# Altium footprint library Generic Footprint.PcbLib: 160 footprints (part 10 of 20) (continued)
## Symbol_CE-Logo-6x4mm_Silkscreen [mil] (continued)
1(89.67,165.14) 1(89.9,0.73) 1(89.9,25.3) 1(90.38,165.14) 1(91.32,0.97) 1(91.32,25.3) 1(91.79,1.21) 1(91.79,1.44) 1(91.79,1.68) 1(91.79,1.92) 1(91.79,2.15) 1(91.79,2.39) 1(91.79,2.62) 1(91.79,2.86) 1(91.79,3.1) 1(91.79,3.33) 1(91.79,3.57) 1(91.79,3.81) 1(91.79,4.04) 1(91.79,4.28) 1(91.79,4.51) 1(91.79,4.75) 1(91.79,4.99) 1(91.79,5.22) 1(91.79,5.46) 1(91.79,5.7) 1(91.79,5.93) 1(91.79,6.17) 1(91.79,6.4) 1(91.79,6.64) 1(91.79,6.88) 1(91.79,7.11) 1(91.79,7.35) 1(91.79,7.59) 1(91.79,7.82) 1(91.79,8.06) 1(91.79,8.29) 1(91.79,8.53) 1(91.79,8.77) 1(91.79,9) 1(91.79,9.24) 1(91.79,9.48) 1(91.79,9.71) 1(91.79,9.95) 1(91.79,10.18) 1(91.79,10.42) 1(91.79,10.66) 1(91.79,10.89) 1(91.79,11.13) 1(91.79,11.36) 1(91.79,11.6) 1(91.79,11.84) 1(91.79,12.07) 1(91.79,12.31) 1(91.79,12.55) 1(91.79,12.78) 1(91.79,13.02) 1(91.79,13.25) 1(91.79,13.49) 1(91.79,13.73) 1(91.79,13.96) 1(91.79,14.2) 1(91.79,14.44) 1(91.79,14.67) 1(91.79,14.91) 1(91.79,15.14) 1(91.79,15.38) 1(91.79,15.62) 1(91.79,15.85) 1(91.79,16.09) 1(91.79,16.33) 1(91.79,16.56) 1(91.79,16.8) 1(91.79,17.03) 1(91.79,17.27) 1(91.79,17.51) 1(91.79,17.74) 1(91.79,17.98) 1(91.79,18.22) 1(91.79,18.45) 1(91.79,18.69) 1(91.79,18.92) 1(91.79,19.16) 1(91.79,19.4) 1(91.79,19.63) 1(91.79,19.87) 1(91.79,20.11) 1(91.79,20.34) 1(91.79,20.58) 1(91.79,20.81) 1(91.79,21.05) 1(91.79,21.29) 1(91.79,21.52) 1(91.79,21.76) 1(91.79,21.99) 1(91.79,22.23) 1(91.79,22.47) 1(91.79,22.7) 1(91.79,22.94) 1(91.79,23.18) 1(91.79,23.41) 1(91.79,23.65) 1(91.79,23.88) 1(91.79,24.12) 1(91.79,24.36) 1(91.79,24.59) 1(91.79,24.83) 1(91.79,25.07) 1(91.79,25.3) 1(91.79,141.05) 1(91.79,141.29) 1(91.79,141.52) 1(91.79,141.76) 1(91.79,141.99) 1(91.79,142.23) 1(91.79,142.47) 1(91.79,142.7) 1(91.79,142.94) 1(91.79,143.18) 1(91.79,143.41) 1(91.79,143.65) 1(91.79,143.88) 1(91.79,144.12) 1(91.79,144.36) 1(91.79,144.59) 1(91.79,144.83) 1(91.79,145.07) 1(91.79,145.3) 1(91.79,145.54) 1(91.79,145.77) 1(91.79,146.01) 1(91.79,146.25) 1(91.79,146.48) 1(91.79,146.72) 1(91.79,146.96) 1(91.79,147.19) 1(91.79,147.43) 1(91.79,147.66) 1(91.79,147.9) 1(91.79,148.14) 1(91.79,148.37) 1(91.79,148.61) 1(91.79,148.85) 1(91.79,149.08) 1(91.79,149.32) 1(91.79,149.55) 1(91.79,149.79) 1(91.79,150.03) 1(91.79,150.26) 1(91.79,150.5) 1(91.79,150.74) 1(91.79,150.97) 1(91.79,151.21) 1(91.79,151.44) 1(91.79,151.68) 1(91.79,151.92) 1(91.79,152.15) 1(91.79,152.39) 1(91.79,152.62) 1(91.79,152.86) 1(91.79,153.1) 1(91.79,153.33) 1(91.79,153.57) 1(91.79,153.81) 1(91.79,154.04) 1(91.79,154.28) 1(91.79,154.51) 1(91.79,154.75) 1(91.79,154.99) 1(91.79,155.22) 1(91.79,155.46) 1(91.79,155.7) 1(91.79,155.93) 1(91.79,156.17) 1(91.79,156.4) 1(91.79,156.64) 1(91.79,156.88) 1(91.79,157.11) 1(91.79,157.35) 1(91.79,157.59) 1(91.79,157.82) 1(91.79,158.06) 1(91.79,158.29) 1(91.79,158.53) 1(91.79,158.77) 1(91.79,159) 1(91.79,159.24) 1(91.79,159.48) 1(91.79,159.71) 1(91.79,159.95) 1(91.79,160.18) 1(91.79,160.42) 1(91.79,160.66) 1(91.79,160.89) 1(91.79,161.13) 1(91.79,161.36) 1(91.79,161.6) 1(91.79,161.84) 1(91.79,162.07) 1(91.79,162.31) 1(91.79,162.55) 1(91.79,162.78) 1(91.79,163.02) 1(91.79,163.25) 1(91.79,163.49) 1(91.79,163.73) 1(91.79,163.96) 1(91.79,164.2) 1(91.79,164.44) 1(91.79,164.67) 1(92.03,164.91) 1(141.87,79.4) 1(141.87,79.63) 1(141.87,79.87) 1(141.87,80.11) 1(141.87,80.34) 1(141.87,84.12) 1(141.87,84.36) 1(141.87,84.59) 1(141.87,85.07) 1(141.87,85.3) 1(141.87,85.54) 1(141.87,85.77) 1(141.87,86.01) 1(141.87,86.25) 1(141.87,86.48) 1(141.87,86.72) 1(141.87,86.96) 1(142.11,79.16) 1(142.11,80.58) 1(142.11,80.81) 1(142.11,81.05) 1(142.11,81.29) 1(142.11,81.52) 1(142.11,81.76) 1(142.11,81.99) 1(142.11,82.23) 1(142.11,82.47) 1(142.11,82.7) 1(142.11,82.94) 1(142.11,83.18) 1(142.11,83.41) 1(142.11,83.65) 1(142.11,83.88) 1(142.35,74.67) 1(142.35,74.91) 1(142.35,75.14) 1(142.35,75.38) 1(142.35,75.62) 1(142.35,75.85) 1(142.35,76.09) 1(142.35,76.33) 1(142.35,76.56) 1(142.35,76.8) 1(142.35,77.03) 1(142.35,77.27) 1(142.35,77.51) 1(142.35,77.74) 1(142.35,77.98) 1(142.35,78.22) 1(142.35,78.45) 1(142.35,78.69) 1(142.35,78.92) 1(142.35,84.83) 1(142.35,87.19) 1(142.35,87.43) 1(142.35,87.66) 1(142.35,87.9) 1(142.35,88.14) 1(142.35,88.37) 1(142.35,88.61) 1(142.35,88.85) 1(142.35,89.08) 1(142.35,89.32) 1(142.35,89.55) 1(142.35,89.79) 1(142.35,90.03) 1(142.35,90.26) 1(142.35,90.5) 1(142.58,74.2) 1(142.58,74.44) 1(142.82,70.42) 1(142.82,70.66) 1(142.82,71.6) 1(142.82,72.31) 1(142.82,72.78) 1(142.82,73.02) 1(142.82,73.25) 1(142.82,73.73) 1(142.82,73.96) 1(142.82,90.74) 1(142.82,91.21) 1(142.82,91.68) 1(142.82,91.92) 1(142.82,92.15) 1(142.82,92.39) 1(142.82,92.62) 1(142.82,92.86) 1(142.82,93.1) 1(142.82,93.33) 1(142.82,93.81) 1(142.82,94.75) 1(142.82,95.46) 1(143.05,69.71) 1(143.05,69.95) 1(143.05,70.18) 1(143.05,70.89) 1(143.05,71.13) 1(143.05,71.36) 1(143.05,71.84) 1(143.05,72.07) 1(143.05,72.55) 1(143.05,73.49) 1(143.05,90.97) 1(143.05,91.44) 1(143.05,93.57) 1(143.05,94.04) 1(143.05,94.28) 1(143.05,94.51) 1(143.05,94.99) 1(143.05,95.22) 1(143.05,95.7) 1(143.29,69) 1(143.29,69.24) 1(143.29,69.48) 1(143.29,95.93) 1(143.29,96.17) 1(143.29,96.4) 1(143.29,96.64) 1(143.53,66.64) 1(143.53,66.88) 1(143.53,68.29) 1(143.53,96.88) 1(143.53,97.11) 1(143.53,97.59) 1(143.53,98.53) 1(143.53,99) 1(143.76,65.7) 1(143.76,65.93) 1(143.76,66.17) 1(143.76,66.4) 1(143.76,67.11) 1(143.76,67.35) 1(143.76,67.59) 1(143.76,67.82) 1(143.76,68.06) 1(143.76,68.53) 1(143.76,68.77) 1(143.76,97.35) 1(143.76,97.82) 1(143.76,98.06) 1(143.76,98.29) 1(143.76,98.77) 1(143.76,99.24) 1(143.76,99.48) 1(143.76,100.42) 1(144,65.22) 1(144,65.46) 1(144,99.71) 1(144,99.95) 1(144,100.18) 1(144.23,64.28) 1(144.23,64.99) 1(144.47,62.86) 1(144.47,63.1) 1(144.47,63.33) 1(144.47,63.57) 1(144.47,63.81) 1(144.47,64.04) 1(144.47,64.51) 1(144.47,64.75) 1(144.47,100.66) 1(144.47,100.89) 1(144.47,101.13) 1(144.47,101.36) 1(144.47,101.6) 1(144.47,101.84) 1(144.47,102.07) 1(144.47,102.31) 1(144.47,102.55) 1(144.47,103.25) 1(144.71,62.15) 1(144.71,62.39) 1(144.71,62.62) 1(144.71,102.78) 1(144.71,103.02) 1(144.94,61.92) 1(144.94,103.49) 1(145.18,59.79) 1(145.18,60.26) 1(145.18,60.5) 1(145.18,60.73) 1(145.18,60.97) 1(145.18,61.21) 1(145.18,61.44) 1(145.18,61.68) 1(145.18,103.73) 1(145.18,103.96) 1(145.18,104.2) 1(145.18,104.44) 1(145.18,104.67) 1(145.18,104.91) 1(145.18,105.38) 1(145.18,105.62) 1(145.42,60.03) 1(145.42,105.14) 1(145.89,58.14) 1(145.89,58.85) 1(145.89,59.08) 1(145.89,59.32) 1(145.89,59.55) 1(145.89,105.85) 1(145.89,106.8) 1(146.12,57.43) 1(146.12,57.66) 1(146.12,57.9) 1(146.12,58.37) 1(146.12,58.61) 1(146.12,106.09) 1(146.12,106.33) 1(146.12,106.56) 1(146.12,107.03) 1(146.12,107.27) 1(146.12,107.51) 1(146.12,107.74) 1(146.12,107.98) 1(146.6,55.54) 1(146.6,56.96) 1(146.6,108.22) 1(146.6,108.45) 1(146.6,108.69) 1(146.6,109.4) 1(146.83,55.3) 1(146.83,55.77) 1(146.83,56.01) 1(146.83,56.25) 1(146.83,56.48) 1(146.83,56.72) 1(146.83,57.19) 1(146.83,108.92) 1(146.83,109.16) 1(146.83,109.63) 1(146.83,109.87) 1(146.83,110.11) 1(146.83,110.34) 1(147.31,55.07) 1(147.54,53.18) 1(147.54,53.41) 1(147.54,53.65) 1(147.54,53.88) 1(147.54,54.12) 1(147.54,54.36) 1(147.54,54.59) 1(147.54,54.83) 1(147.54,110.58) 1(147.54,110.81) 1(147.54,111.05) 1(147.54,111.29) 1(147.54,111.52) 1(147.54,111.76) 1(147.54,111.99) 1(147.54,112.23) 1(147.78,52.94) 1(147.78,112.47) 1(148.01,112.7) 1(148.25,51.29) 1(148.25,51.52) 1(148.25,51.76) 1(148.25,51.99) 1(148.25,52.23) 1(148.25,52.47) 1(148.25,52.7) 1(148.25,112.94) 1(148.25,113.18) 1(148.25,113.41) 1(148.25,113.65) 1(148.25,113.88) 1(148.25,114.12) 1(148.49,50.81) 1(148.49,51.05) 1(148.96,49.4) 1(148.96,50.11) 1(148.96,50.58) 1(148.96,114.36) 1(148.96,114.59) 1(148.96,114.83) 1(148.96,115.07) 1(148.96,115.3) 1(148.96,115.54) 1(149.2,49.63) 1(149.2,49.87) 1(149.2,50.34) 1(149.2,115.77) 1(149.2,116.01) 1(149.2,116.25) 1(149.43,49.16) 1(149.67,47.74) 1(149.67,48.22) 1(149.67,48.69) 1(149.67,48.92) 1(149.67,116.48) 1(149.67,117.19) 1(149.9,47.98) 1(149.9,48.45) 1(149.9,116.72) 1(149.9,116.96) 1(149.9,117.43) 1(149.9,117.66) 1(149.9,117.9) 1(150.14,47.51) 1(150.38,47.27) 1(150.61,46.33) 1(150.61,46.56) 1(150.61,46.8) 1(150.61,47.03) 1(150.61,118.14) 1(150.61,118.37) 1(150.61,118.61) 1(150.61,118.85) 1(150.61,119.08) 1(150.61,119.32) 1(150.85,46.09) 1(151.09,45.38) 1(151.09,119.55) 1(151.32,44.67) 1(151.32,44.91) 1(151.32,45.14) 1(151.32,45.62) 1(151.32,45.85) 1(151.32,119.79) 1(151.32,120.03) 1(151.32,120.26) 1(151.32,120.5) 1(151.32,120.74) 1(151.56,120.97) 1(152.03,43.49) 1(152.03,43.73) 1(152.03,43.96) 1(152.03,44.2) 1(152.03,44.44) 1(152.03,121.21) 1(152.03,121.44) 1(152.03,121.68) 1(152.03,121.92) 1(152.27,43.02) 1(152.27,43.25) 1(152.27,122.15) 1(152.27,122.39) 1(152.74,41.84) 1(152.74,42.07) 1(152.74,122.62) 1(152.98,42.31) 1(152.98,42.55) 1(152.98,42.78) 1(152.98,122.86) 1(152.98,123.1) 1(153.21,41.6) 1(153.45,123.33) 1(153.45,123.81) 1(153.68,40.89) 1(153.68,41.13) 1(153.68,41.36) 1(153.68,123.57) 1(153.68,124.04) 1(153.68,124.28) 1(153.68,124.51) 1(153.68,124.75) 1(154.16,39.95) 1(154.16,40.18) 1(154.16,40.66) 1(154.16,125.22) 1(154.39,39.48) 1(154.39,39.71) 1(154.39,40.42) 1(154.39,124.99) 1(154.39,125.46) 1(154.39,125.7) 1(154.39,125.93) 1(154.39,126.17) 1(154.86,39.24) 1(155.1,38.53) 1(155.1,38.77) 1(155.1,39) 1(155.1,126.4) 1(155.1,126.64) 1(155.1,126.88) 1(155.81,37.11) 1(155.81,37.35) 1(155.81,37.59) 1(155.81,37.82) 1(155.81,38.06) 1(155.81,38.29) 1(155.81,127.11) 1(155.81,127.35) 1(155.81,127.59) 1(155.81,127.82) 1(155.81,128.06) 1(155.81,128.29) 1(155.81,128.53) 1(156.52,36.88) 1(156.52,128.77) 1(156.52,129.24) 1(156.75,36.4) 1(156.75,36.64) 1(156.75,129) 1(156.99,36.17) 1(157.23,35.22) 1(157.23,35.7) 1(157.23,35.93) 1(157.23,129.48) 1(157.23,129.95) 1(157.46,34.75) 1(157.46,34.99) 1(157.46,35.46) 1(157.46,129.71) 1(157.46,130.18) 1(157.46,130.42) 1(157.46,130.66) 1(157.7,130.89) 1(158.17,34.04) 1(158.17,34.28) 1(158.17,34.51) 1(158.17,131.13) 1(158.17,131.36) 1(158.17,131.6) 1(158.64,131.84) 1(158.88,33.33) 1(158.88,33.57) 1(158.88,33.81) 1(158.88,132.07) 1(158.88,132.31) 1(159.59,32.39) 1(159.59,32.62) 1(159.59,33.1) 1(159.59,132.55) 1(159.59,132.78) 1(159.59,133.02) 1(159.59,133.25) 1(159.83,31.92) 1(159.83,32.15) 1(159.83,32.86) 1(159.83,133.49) 1(159.83,133.73) 1(160.06,31.68) 1(160.3,31.21) 1(160.3,31.44) 1(160.3,133.96) 1(160.53,30.97) 1(160.53,134.2) 1(160.53,134.44) 1(160.77,134.67) 1(161.24,30.26) 1(161.24,30.5) 1(161.24,30.73) 1(161.24,134.91) 1(161.24,135.14) 1(161.24,135.38) 1(161.48,30.03) 1(161.95,29.55) 1(161.95,29.79) 1(161.95,135.62) 1(161.95,135.85) 1(161.95,136.09) 1(162.19,29.32) 1(162.66,28.61) 1(162.66,28.85) 1(162.66,29.08) 1(162.66,136.33) 1(162.66,136.56) 1(162.66,136.8) 1(163.37,28.37) 1(163.37,137.03) 1(163.37,137.51) 1(163.61,27.9) 1(163.61,28.14) 1(163.61,137.27) 1(164.08,26.96) 1(164.08,27.19) 1(164.08,27.43) 1(164.08,27.66) 1(164.08,137.74) 1(164.08,138.22) 1(164.31,26.25) 1(164.31,26.48) 1(164.31,26.72) 1(164.31,137.98) 1(164.31,138.45) 1(164.31,138.69) 1(164.31,138.92) 1(164.55,139.16) 1(164.79,26.01) 1(165.02,25.77) 1(165.02,139.4) 1(165.02,139.63) 1(165.02,139.87) 1(165.26,25.54) 1(165.49,25.3) 1(165.49,140.11) 1(165.73,25.07) 1(165.73,140.34) 1(165.73,140.58) 1(166.44,24.36) 1(166.44,24.59) 1(166.44,24.83) 1(166.44,140.81) 1(166.44,141.05) 1(166.44,141.29) 1(166.68,24.12) 1(167.15,23.65) 1(167.15,23.88) 1(167.15,141.52) 1(167.38,23.41) 1(167.38,141.76) 1(167.38,141.99) 1(167.38,142.23) 1(167.62,69.71) 1(167.62,70.42) 1(167.62,70.66) 1(167.62,95.46) 1(167.62,95.7) 1(167.86,23.18) 1(167.86,69.48) 1(167.86,69.95) 1(167.86,70.18) 1(167.86,70.89) 1(167.86,95.22) 1(167.86,95.93) 1(168.09,22.47) 1(168.09,22.7) 1(168.09,22.94) 1(168.09,69.24) 1(168.09,96.17) 1(168.09,96.4) 1(168.09,96.64) 1(168.09,142.47) 1(168.09,142.7) 1(168.33,68.77) 1(168.33,71.13) 1(168.33,96.88) 1(168.33,97.11) 1(168.33,142.94) 1(168.57,66.64) 1(168.57,66.88) 1(168.57,67.11) 1(168.57,67.35) 1(168.57,67.59) 1(168.57,67.82) 1(168.57,68.06) 1(168.57,68.29) 1(168.57,68.53) 1(168.57,69) 1(168.57,71.13) 1(168.57,95.22) 1(168.57,97.35) 1(168.57,97.59) 1(168.57,97.82) 1(168.57,98.06) 1(168.57,98.29) 1(168.57,98.53) 1(168.57,98.77) 1(168.57,99) 1(168.8,22.23) 1(168.8,66.4) 1(168.8,70.89) 1(168.8,95.22) 1(168.8,99.24) 1(169.04,21.99) 1(169.04,66.17) 1(169.04,70.89) 1(169.04,99.48) 1(169.04,99.71) 1(169.27,21.76) 1(169.27,64.04) 1(169.27,64.28) 1(169.27,64.51) 1(169.27,64.75) 1(169.27,64.99) 1(169.27,65.22) 1(169.27,65.46) 1(169.27,65.7) 1(169.27,65.93) 1(169.27,99.95) 1(169.27,100.18) 1(169.27,100.42) 1(169.27,100.66) 1(169.27,100.89) 1(169.27,101.13) 1(169.27,101.36) 1(169.51,143.18) 1(169.51,143.41) 1(169.51,143.65) 1(169.75,101.6) 1(169.75,101.84) 1(169.98,62.15) 1(169.98,62.39) 1(169.98,62.62) 1(169.98,62.86) 1(169.98,63.1) 1(169.98,63.33) 1(169.98,63.57) 1(169.98,63.81) 1(169.98,102.07) 1(169.98,102.31) 1(169.98,102.55) 1(169.98,102.78) 1(169.98,103.02) 1(169.98,103.25) 1(169.98,103.49) 1(169.98,103.73) 1(170.22,21.05) 1(170.22,21.29) 1(170.22,21.52) 1(170.22,61.92) 1(170.22,143.88) 1(170.22,144.12) 1(170.22,144.36) 1(170.46,103.96) 1(170.69,60.5) 1(170.69,60.73) 1(170.69,60.97) 1(170.69,61.21) 1(170.69,61.44) 1(170.69,104.2) 1(170.69,104.44) 1(170.69,104.67) 1(170.69,104.91) 1(170.69,105.14) 1(170.69,105.38) 1(170.69,105.62) 1(170.69,105.85) 1(170.93,20.34) 1(170.93,20.58) 1(170.93,20.81) 1(170.93,60.26) 1(170.93,61.68) 1(170.93,106.09) 1(170.93,144.59) 1(170.93,144.83) 1(170.93,145.07) 1(170.93,145.3) 1(171.16,60.26) 1(171.16,106.09) 1(171.16,145.3) 1(171.4,59.55) 1(171.4,59.79) 1(171.4,60.03) 1(171.4,60.26) 1(171.4,106.09) 1(171.64,20.11) 1(171.64,58.14) 1(171.64,58.37) 1(171.64,58.61) 1(171.64,58.85) 1(171.64,59.08) 1(171.64,59.32) 1(171.64,106.33) 1(171.64,106.56) 1(171.64,106.8) 1(171.64,107.03) 1(171.64,107.27) 1(171.64,107.51) 1(171.64,145.3) 1(171.64,145.54) 1(171.64,145.77) 1(171.87,19.63) 1(171.87,19.87) 1(171.87,146.01) 1(172.35,56.48) 1(172.35,56.72) 1(172.35,56.96) 1(172.35,57.19) 1(172.35,57.43) 1(172.35,57.66) 1(172.35,57.9) 1(172.35,107.74) 1(172.35,107.98) 1(172.35,108.22) 1(172.35,108.45) 1(172.35,108.69) 1(172.35,108.92) 1(172.58,18.92) 1(172.58,19.16) 1(172.58,19.4) 1(172.58,146.25) 1(172.58,146.48) 1(172.58,146.72) 1(172.82,18.69) 1(172.82,109.16) 1(173.05,18.69) 1(173.05,55.07) 1(173.05,55.3) 1(173.05,55.54) 1(173.05,55.77) 1(173.05,56.01) 1(173.05,56.25) 1(173.05,109.4) 1(173.05,109.63) 1(173.05,109.87) 1(173.05,110.11) 1(173.05,110.34) 1(173.29,18.22) 1(173.29,18.45) 1(173.29,18.69) 1(173.29,146.96) 1(173.29,147.19) 1(173.53,17.98) 1(173.53,110.58) 1(173.53,147.43) 1(173.76,54.36) 1(173.76,54.59) 1(173.76,54.83) 1(173.76,110.81) 1(173.76,111.05) 1(173.76,111.29) 1(173.76,111.76) 1(173.76,111.99) 1(174,111.52) 1(174.23,17.98) 1(174.23,54.12) 1(174.47,17.98) 1(174.47,52.94) 1(174.47,53.41) 1(174.47,53.65) 1(174.47,53.88) 1(174.47,112.23) 1(174.47,112.47) 1(174.47,112.7) 1(174.71,17.27) 1(174.71,17.74) 1(174.71,52.7) 1(174.71,53.18) 1(174.71,112.94) 1(174.71,147.66) 1(174.71,147.9) 1(174.71,148.14) 1(174.94,17.51) 1(175.18,52.47) 1(175.42,17.03) 1(175.42,51.29) 1(175.42,51.52) 1(175.42,51.76) 1(175.42,51.99) 1(175.42,52.23) 1(175.42,113.18) 1(175.42,113.41) 1(175.42,113.65) 1(175.42,113.88) 1(175.42,114.12) 1(175.42,114.36) 1(175.42,148.37) 1(175.65,16.56) 1(175.65,16.8) 1(175.65,148.61) 1(175.65,148.85) 1(175.65,149.08) 1(176.12,50.58) 1(176.12,50.81) 1(176.12,51.05) 1(176.12,114.59) 1(176.12,114.83) 1(176.12,115.07) 1(176.12,149.32) 1(176.36,15.85) 1(176.36,16.09) 1(176.36,16.33) 1(176.36,149.55) 1(176.6,50.34) 1(176.6,115.3) 1(176.6,149.79) 1(176.83,48.92) 1(176.83,49.16) 1(176.83,49.4) 1(176.83,49.63) 1(176.83,49.87) 1(176.83,50.11) 1(176.83,115.54) 1(176.83,115.77) 1(176.83,116.01) 1(176.83,116.25) 1(176.83,116.48) 1(177.07,15.62) 1(177.31,15.62) 1(177.31,116.72) 1(177.54,15.62) 1(177.54,48.45) 1(177.54,48.69) 1(177.54,116.96) 1(177.54,117.19) 1(177.78,15.14) 1(177.78,48.22) 1(177.78,150.03) 1(177.78,150.26) 1(177.78,150.5) 1(178.01,14.91) 1(178.01,15.38) 1(178.01,117.43) 1(178.25,47.98) 1(178.25,117.66) 1(178.25,117.9) 1(178.25,118.61) 1(178.49,14.67) 1(178.49,47.51) 1(178.49,47.74) 1(178.49,118.14) 1(178.49,118.37) 1(178.49,118.85) 1(178.49,150.74) 1(178.72,14.44) 1(178.72,150.97) 1(178.72,151.21) 1(178.96,14.2) 1(178.96,47.03) 1(178.96,47.27) 1(179.2,45.85) 1(179.2,46.09) 1(179.2,46.33) 1(179.2,46.56) 1(179.2,46.8) 1(179.2,119.08) 1(179.2,119.32) 1(179.2,119.55) 1(179.43,14.2) 1(179.67,14.2) 1(179.9,45.38) 1(179.9,45.62) 1(179.9,119.79) 1(179.9,120.03) 1(179.9,120.26) 1(179.9,151.44) 1(180.14,13.49) 1(180.14,13.73) 1(180.14,13.96) 1(180.14,45.14) 1(180.14,120.5) 1(180.14,151.68) 1(180.14,151.92) 1(180.38,120.5) 1(180.61,44.44) 1(180.61,44.67) 1(180.61,44.91) 1(180.61,120.5) 1(180.61,120.74) 1(180.61,120.97) 1(180.61,152.15) 1(180.85,13.02) 1(180.85,13.25) 1(180.85,152.39) 1(180.85,152.62) 1(181.09,121.21) 1(181.09,152.86) 1(181.32,12.78) 1(181.32,43.96) 1(181.32,44.2) 1(181.32,121.44) 1(181.32,121.68) 1(181.56,43.73) 1(181.56,121.92) 1(182.03,43.02) 1(182.03,43.49) 1(182.03,122.15) 1(182.03,122.62) 1(182.27,12.55) 1(182.27,43.25) 1(182.27,122.39) 1(182.27,153.1) 1(182.27,153.33) 1(182.5,12.07) 1(182.5,12.31) 1(182.5,42.78) 1(182.5,153.57) 1(182.74,42.78) 1(182.74,122.86) 1(182.98,42.07) 1(182.98,42.31) 1(182.98,42.55) 1(182.98,42.78) 1(182.98,123.1) 1(182.98,123.33) 1(182.98,153.81) 1(183.21,11.84) 1(183.21,123.57) 1(183.21,154.04) 1(183.45,11.84) 1(183.45,70.89) 1(183.45,154.28) 1(183.68,11.84) 1(183.68,41.36) 1(183.68,41.6) 1(183.68,41.84) 1(183.68,70.89) 1(183.68,123.81) 1(183.68,124.04) 1(183.92,11.13) 1(183.92,11.36) 1(183.92,11.6) 1(183.92,124.28) 1(184.39,40.66) 1(184.39,40.89) 1(184.39,41.13) 1(184.39,70.89) 1(184.39,124.51) 1(184.39,124.75) 1(184.39,124.99) 1(184.39,154.51) 1(184.63,10.89) 1(184.63,154.75) 1(184.63,154.99) 1(184.86,10.66) 1(184.86,70.89) 1(185.1,40.42) 1(185.1,70.89) 1(185.1,125.22) 1(185.1,125.46) 1(185.34,39.95) 1(185.34,40.18) 1(185.34,70.89) 1(185.34,125.7) 1(185.57,10.42) 1(185.57,155.22) 1(185.81,155.22) 1(186.05,39) 1(186.05,39.24) 1(186.05,39.48) 1(186.05,39.71) 1(186.05,125.93) 1(186.05,126.17) 1(186.05,126.4) 1(186.28,9.95) 1(186.28,10.18) 1(186.28,155.22) 1(186.28,155.46) 1(186.28,155.7) 1(186.52,9.71) 1(186.75,38.29) 1(186.75,38.53) 1(186.75,38.77) 1(186.75,126.64) 1(186.75,126.88) 1(186.75,127.11) 1(186.75,155.93) 1(187.23,70.89) 1(187.46,37.59) 1(187.46,37.82) 1(187.46,38.06) 1(187.46,70.89) 1(187.46,127.35) 1(187.46,127.59) 1(187.46,127.82) 1(187.46,155.93) 1(187.7,9.24) 1(187.7,9.48) 1(187.7,128.06) 1(187.7,155.93) 1(187.7,156.17) 1(187.94,9) 1(187.94,128.06) 1(187.94,156.4) 1(187.94,156.64) 1(188.17,70.89) 1(188.17,128.06) 1(188.17,128.29) 1(188.17,128.53) 1(188.41,128.77) 1(188.64,70.89) 1(188.88,37.11) 1(188.88,37.35) 1(189.12,8.53) 1(189.12,8.77) 1(189.12,36.88) 1(189.12,156.88) 1(189.35,157.11) 1(189.35,157.35) 1(189.59,8.29) 1(189.59,36.64) 1(189.59,129) 1(189.83,36.17) 1(189.83,36.4) 1(189.83,129.24) 1(189.83,129.48) 1(190.06,8.06) 1(190.3,8.06) 1(190.53,8.06) 1(190.53,35.22) 1(190.53,35.46) 1(190.53,35.7) 1(190.53,35.93) 1(190.53,129.71) 1(190.53,129.95) 1(190.53,130.18) 1(190.77,7.82) 1(190.77,130.42) 1(190.77,157.59) 1(190.77,157.82) 1(191.01,7.59) 1(191.01,130.42) 1(191.01,158.06) 1(191.24,130.42) 1(191.24,130.66) 1(191.24,130.89) 1(191.48,7.35) 1(191.48,131.13) 1(191.72,131.13) 1(191.95,34.75) 1(191.95,34.99) 1(192.19,34.51) 1(192.19,158.29) 1(192.42,158.53) 1(192.66,131.13) 1(192.66,131.6) 1(192.66,158.77) 1(192.66,159) 1(192.9,6.64) 1(192.9,6.88) 1(192.9,7.11) 1(192.9,33.81) 1(192.9,34.04) 1(192.9,34.28) 1(192.9,131.36) 1(192.9,131.84) 1(192.9,159) 1(193.13,6.64) 1(193.13,131.84) 1(193.37,6.64) 1(193.61,131.84) 1(193.61,132.07) 1(193.61,132.31) 1(193.61,132.55) 1(194.08,33.57) 1(194.31,33.1) 1(194.31,33.33) 1(194.31,159) 1(194.55,6.17) 1(194.55,6.4) 1(194.55,159.24) 1(194.55,159.48) 1(194.79,5.93) 1(195.02,132.78) 1(195.02,133.02) 1(195.02,133.25) 1(195.02,159.71) 1(195.26,32.86) 1(195.73,32.62) 1(195.97,32.39) 1(196.2,32.15) 1(196.2,159.95) 1(196.2,160.18) 1(196.44,32.15) 1(196.44,133.49) 1(196.68,5.7) 1(196.68,31.44) 1(196.68,31.68) 1(196.68,31.92) 1(196.68,32.15) 1(196.68,133.73) 1(196.68,133.96) 1(196.68,134.2) 1(196.68,160.42) 1(196.91,5.22) 1(196.91,5.46) 1(196.91,134.2) 1(197.38,134.2) 1(198.09,30.73) 1(198.09,30.97) 1(198.09,31.21) 1(198.09,134.44) 1(198.09,134.67) 1(198.33,160.66) 1(198.33,160.89) 1(198.57,134.91) 1(198.57,161.13) 1(199.04,4.51) 1(199.04,4.75) 1(199.04,4.99) 1(199.27,135.14) 1(199.75,4.28) 1(199.75,30.03) 1(199.75,30.26) 1(199.75,30.5) 1(199.75,135.38) 1(199.98,135.62) 1(200.46,161.36) 1(200.46,161.6) 1(200.69,29.79) 1(200.93,29.79) 1(200.93,70.89) 1(200.93,161.84) 1(201.16,29.32) 1(201.16,29.55) 1(201.16,29.79) 1(201.16,70.89) 1(201.16,135.85) 1(201.16,136.09) 1(201.4,3.81) 1(201.4,4.04) 1(201.4,136.33) 1(202.11,70.89) 1(202.35,3.57) 1(202.35,70.89) 1(202.58,136.56) 1(202.58,136.8) 1(202.58,137.03) 1(202.58,162.07) 1(202.82,29.08) 1(202.82,162.07) 1(203.29,28.85) 1(203.53,3.33) 1(203.53,28.37) 1(203.53,28.61) 1(203.53,162.07) 1(203.53,162.31) 1(203.53,162.55) 1(203.76,3.1) 1(203.76,137.27) 1(204,28.37) 1(204,70.89) 1(204,137.27) 1(204.23,70.89) 1(204.47,2.86) 1(204.47,28.37) 1(204.47,137.27) 1(204.71,2.86) 1(204.71,162.78) 1(204.94,137.51) 1(205.18,2.86) 1(205.18,28.14) 1(205.18,137.74) 1(205.65,27.66) 1(205.65,27.9) 1(205.89,163.02) 1(206.12,137.98) 1(206.6,2.62) 1(206.83,2.39) 1(206.83,163.25) 1(207.07,27.43) 1(207.07,138.22) 1(207.31,138.45) 1(207.31,163.49) 1(208.01,2.15) 1(208.01,26.96) 1(208.01,27.19) 1(208.01,138.69) 1(209.2,138.92) 1(209.43,139.16) 1(209.67,139.4) 1(209.67,163.73) 1(209.9,26.72) 1(209.9,139.4) 1(209.9,163.96) 1(210.14,139.4) 1(210.38,1.68) 1(210.38,1.92) 1(210.38,26.25) 1(210.38,26.48) 1(210.85,164.2) 1(211.09,1.21) 1(211.09,1.44) 1(211.32,1.21) 1(211.32,1.44) 1(211.56,1.21) 1(211.56,1.44) 1(212.03,1.21) 1(212.03,139.63) 1(212.27,139.4) 1(212.27,139.63) 1(212.5,139.4) 1(212.5,139.63) 1(212.5,139.87) 1(212.5,140.11) 1(212.98,26.01) 1(213.21,1.21) 1(213.68,25.77) 1(214.16,0.97) 1(214.16,25.3) 1(214.16,25.54) 1(214.16,164.44) 1(214.16,164.67) 1(214.16,164.91) 1(214.39,0.97) 1(214.63,0.73) 1(214.63,0.97) 1(214.63,164.91) 1(214.86,0.73) 1(214.86,0.97) 1(214.86,1.21) 1(215.1,1.21) 1(215.1,25.3) 1(215.1,140.34) 1(215.34,1.21) 1(215.34,25.3) 1(215.34,164.91) 1(215.57,1.21) 1(215.57,25.3) 1(216.05,25.3) 1(216.28,25.3) 1(216.28,92.39) 1(216.28,92.86) 1(216.52,0.97) 1(216.75,25.3) 1(216.75,71.13) 1(216.75,71.36) 1(216.75,71.6) 1(216.75,71.84) 1(216.75,72.07) 1(216.75,72.31) 1(216.75,72.55) 1(216.75,72.78) 1(216.75,73.02) 1(216.75,73.25) 1(216.75,73.49) 1(216.75,73.73) 1(216.75,73.96) 1(216.75,74.2) 1(216.75,74.44) 1(216.75,74.67) 1(216.75,74.91) 1(216.75,75.14) 1(216.75,75.38) 1(216.75,75.62) 1(216.75,75.85) 1(216.75,76.09) 1(216.75,76.33) 1(216.75,76.56) 1(216.75,76.8) 1(216.75,77.03) 1(216.75,77.27) 1(216.75,77.51) 1(216.75,77.74) 1(216.75,77.98) 1(216.75,78.22) 1(216.75,78.45) 1(216.75,78.69) 1(216.75,78.92) 1(216.75,79.16) 1(216.75,79.4) 1(216.75,79.63) 1(216.75,79.87) 1(216.75,80.11) 1(216.75,80.34) 1(216.75,80.58) 1(216.75,80.81) 1(216.75,81.05) 1(216.75,81.29) 1(216.75,81.52) 1(216.75,81.76) 1(216.75,81.99) 1(216.75,82.23) 1(216.75,82.47) 1(216.75,82.7) 1(216.75,82.94) 1(216.75,83.18) 1(216.75,83.41) 1(216.75,83.65) 1(216.75,83.88) 1(216.75,84.12) 1(216.75,84.36) 1(216.75,84.59) 1(216.75,84.83) 1(216.75,85.07) 1(216.75,85.3) 1(216.75,85.54) 1(216.75,85.77) 1(216.75,86.01) 1(216.75,86.25) 1(216.75,86.48) 1(216.75,86.72) 1(216.75,86.96) 1(216.75,87.19) 1(216.75,87.43) 1(216.75,87.66) 1(216.75,87.9) 1(216.75,88.14) 1(216.75,88.37) 1(216.75,88.61) 1(216.75,88.85) 1(216.75,89.08) 1(216.75,89.32) 1(216.75,89.55) 1(216.75,89.79) 1(216.75,90.03) 1(216.75,90.26) 1(216.75,90.5) 1(216.75,90.74) 1(216.75,90.97) 1(216.75,91.21) 1(216.75,91.44) 1(216.75,91.68) 1(216.75,91.92) 1(216.75,92.15) 1(216.75,92.62) 1(216.75,93.1) 1(216.75,93.33) 1(216.75,93.57) 1(216.75,93.81) 1(216.75,94.04) 1(216.75,94.28) 1(216.75,94.51) 1(216.75,94.75) 1(216.75,94.99) 1(216.99,140.58) 1(217.23,140.81) 1(217.94,25.3) 1(217.94,141.05) 1(218.17,141.05) 1(218.64,0.73) 1(218.64,25.07) 1(218.64,25.3) 1(219.35,165.14) 1(220.06,0.5) 1(220.06,24.83) 1(220.3,24.59) 1(220.3,165.14) 1(220.53,0.5) 1(220.53,141.05) 1(220.77,0.5) 1(220.77,141.05) 1(221.01,140.81) 1(221.24,165.14) 1(221.48,165.14) 1(221.72,0.5) 1(221.72,140.81) 1(221.72,165.14) 1(221.95,0.5) 1(221.95,141.05) 1(222.19,0.5) 1(222.42,0.5) 1(222.42,24.59) 1(222.66,0.26) 1(222.9,0.26) 1(222.9,165.14) 1(223.61,165.14) 1(224.08,165.14) 1(224.79,165.14) 1(226.2,165.38) 1(226.68,0.26) 1(226.91,0.26) 1(226.91,165.38) 1(227.15,0.5) 1(227.15,165.14) 1(227.38,0.5) 1(227.38,165.14) 1(227.62,165.14) 1(227.86,165.14) 1(228.33,141.05) 1(228.57,24.59) 1(228.57,140.81) 1(229.27,24.59) 1(229.51,0.5) 1(229.51,24.83) 1(229.51,140.81) 1(229.51,141.05) 1(229.75,141.05) 1(229.98,165.14) 1(230.22,0.5) 1(230.46,0.5) 1(230.69,165.14) 1(230.93,25.07) 1(230.93,25.3) 1(230.93,165.14) 1(231.64,25.3) 1(231.87,0.73) 1(232.82,0.97) 1(232.82,1.21) 1(232.82,1.44) 1(232.82,1.68) 1(232.82,1.92) 1(232.82,2.15) 1(232.82,2.39) 1(232.82,2.62) 1(232.82,2.86) 1(232.82,3.1) 1(232.82,3.33) 1(232.82,3.57) 1(232.82,3.81) 1(232.82,4.04) 1(232.82,4.28) 1(232.82,4.51) 1(232.82,4.75) 1(232.82,4.99) 1(232.82,5.22) 1(232.82,5.46) 1(232.82,5.7) 1(232.82,5.93) 1(232.82,6.17) 1(232.82,6.4) 1(232.82,6.64) 1(232.82,6.88) 1(232.82,7.11) 1(232.82,7.35) 1(232.82,7.59) 1(232.82,7.82) 1(232.82,8.06) 1(232.82,8.29) 1(232.82,8.53) 1(232.82,8.77) 1(232.82,9) 1(232.82,9.24) 1(232.82,9.48) 1(232.82,9.71) 1(232.82,9.95) 1(232.82,10.18) 1(232.82,10.42) 1(232.82,10.66) 1(232.82,10.89) 1(232.82,11.13) 1(232.82,11.36) 1(232.82,11.6) 1(232.82,11.84) 1(232.82,12.07) 1(232.82,12.31) 1(232.82,12.55) 1(232.82,12.78) 1(232.82,13.25) 1(232.82,13.49) 1(232.82,13.73) 1(232.82,14.2) 1(232.82,14.44) 1(232.82,14.67) 1(232.82,14.91) 1(232.82,15.14) 1(232.82,15.38) 1(232.82,15.85) 1(232.82,16.09) 1(232.82,16.33) 1(232.82,16.56) 1(232.82,16.8) 1(232.82,17.03) 1(232.82,17.27) 1(232.82,17.51) 1(232.82,17.74) 1(232.82,17.98) 1(232.82,18.22) 1(232.82,18.45) 1(232.82,18.69) 1(232.82,18.92) 1(232.82,19.16) 1(232.82,19.4) 1(232.82,19.63) 1(232.82,19.87) 1(232.82,20.11) 1(232.82,20.34) 1(232.82,20.58) 1(232.82,20.81) 1(232.82,21.05) 1(232.82,21.29) 1(232.82,21.52) 1(232.82,21.76) 1(232.82,21.99) 1(232.82,22.23) 1(232.82,22.47) 1(232.82,22.7) 1(232.82,22.94) 1(232.82,23.18) 1(232.82,23.41) 1(232.82,23.65) 1(232.82,23.88) 1(232.82,24.12) 1(232.82,24.36) 1(232.82,24.59) 1(232.82,24.83) 1(232.82,25.07) 1(233.05,13.02) 1(233.05,13.96) 1(233.05,15.62) 1(233.05,141.05) 1(233.05,141.52) 1(233.05,141.76) 1(233.05,141.99) 1(233.05,142.47) 1(233.05,142.7) 1(233.05,142.94) 1(233.05,143.18) 1(233.05,143.41) 1(233.05,143.65) 1(233.05,143.88) 1(233.05,144.12) 1(233.05,144.36) 1(233.05,144.59) 1(233.05,144.83) 1(233.05,145.07) 1(233.05,145.3) 1(233.05,145.54) 1(233.05,145.77) 1(233.05,146.01) 1(233.05,146.25) 1(233.05,146.48) 1(233.05,146.72) 1(233.05,146.96) 1(233.05,147.19) 1(233.05,147.43) 1(233.05,147.66) 1(233.05,147.9) 1(233.05,148.14) 1(233.05,148.37) 1(233.05,148.61) 1(233.05,148.85) 1(233.05,149.08) 1(233.05,149.32) 1(233.05,149.79) 1(233.05,150.03) 1(233.05,150.26) 1(233.05,150.5) 1(233.05,150.74) 1(233.05,150.97) 1(233.05,151.21) 1(233.05,151.68) 1(233.05,151.92) 1(233.05,152.15) 1(233.05,152.62) 1(233.05,152.86) 1(233.05,153.1) 1(233.05,153.33) 1(233.05,153.81) 1(233.05,154.04) 1(233.05,154.28) 1(233.05,154.51) 1(233.05,154.75) 1(233.05,154.99) 1(233.05,155.22) 1(233.05,155.7) 1(233.05,155.93) 1(233.05,156.17) 1(233.05,156.4) 1(233.05,156.64) 1(233.05,156.88) 1(233.05,157.11) 1(233.05,157.35) 1(233.05,157.59) 1(233.05,157.82) 1(233.05,158.06) 1(233.05,158.53) 1(233.05,158.77) 1(233.05,159) 1(233.05,159.48) 1(233.05,159.71) 1(233.05,159.95) 1(233.05,160.18) 1(233.05,160.42) 1(233.05,160.66) 1(233.05,160.89) 1(233.05,161.36) 1(233.05,161.6) 1(233.05,161.84) 1(233.05,162.07) 1(233.05,162.55) 1(233.05,162.78) 1(233.05,163.02) 1(233.05,163.25) 1(233.05,163.73) 1(233.05,163.96) 1(233.05,164.2) 1(233.05,164.44) 1(233.05,164.67) 1(233.05,164.91) 1(233.29,141.29) 1(233.29,142.23) 1(233.29,149.55) 1(233.29,151.44) 1(233.29,152.39) 1(233.29,153.57) 1(233.29,155.46) 1(233.29,158.29) 1(233.29,159.24) 1(233.29,161.13) 1(233.29,162.31) 1(233.29,163.49)
Top Overlay:
  drawing of 1554 lines, arcs and shapes, not listed